# Altium footprint library GyokuRe.PcbLib: 1248 footprints (part 18 of 78)
Each footprint in its own frame and in the unit in brackets; x right, y up, seen from the top. Pads: shape width x height; smd on the part's side, far side on the other; paste and mask are expansions set on the pad; w line width, h text height; cw(c..) or ccw(c..) is an arc to the next point about the centre after c.
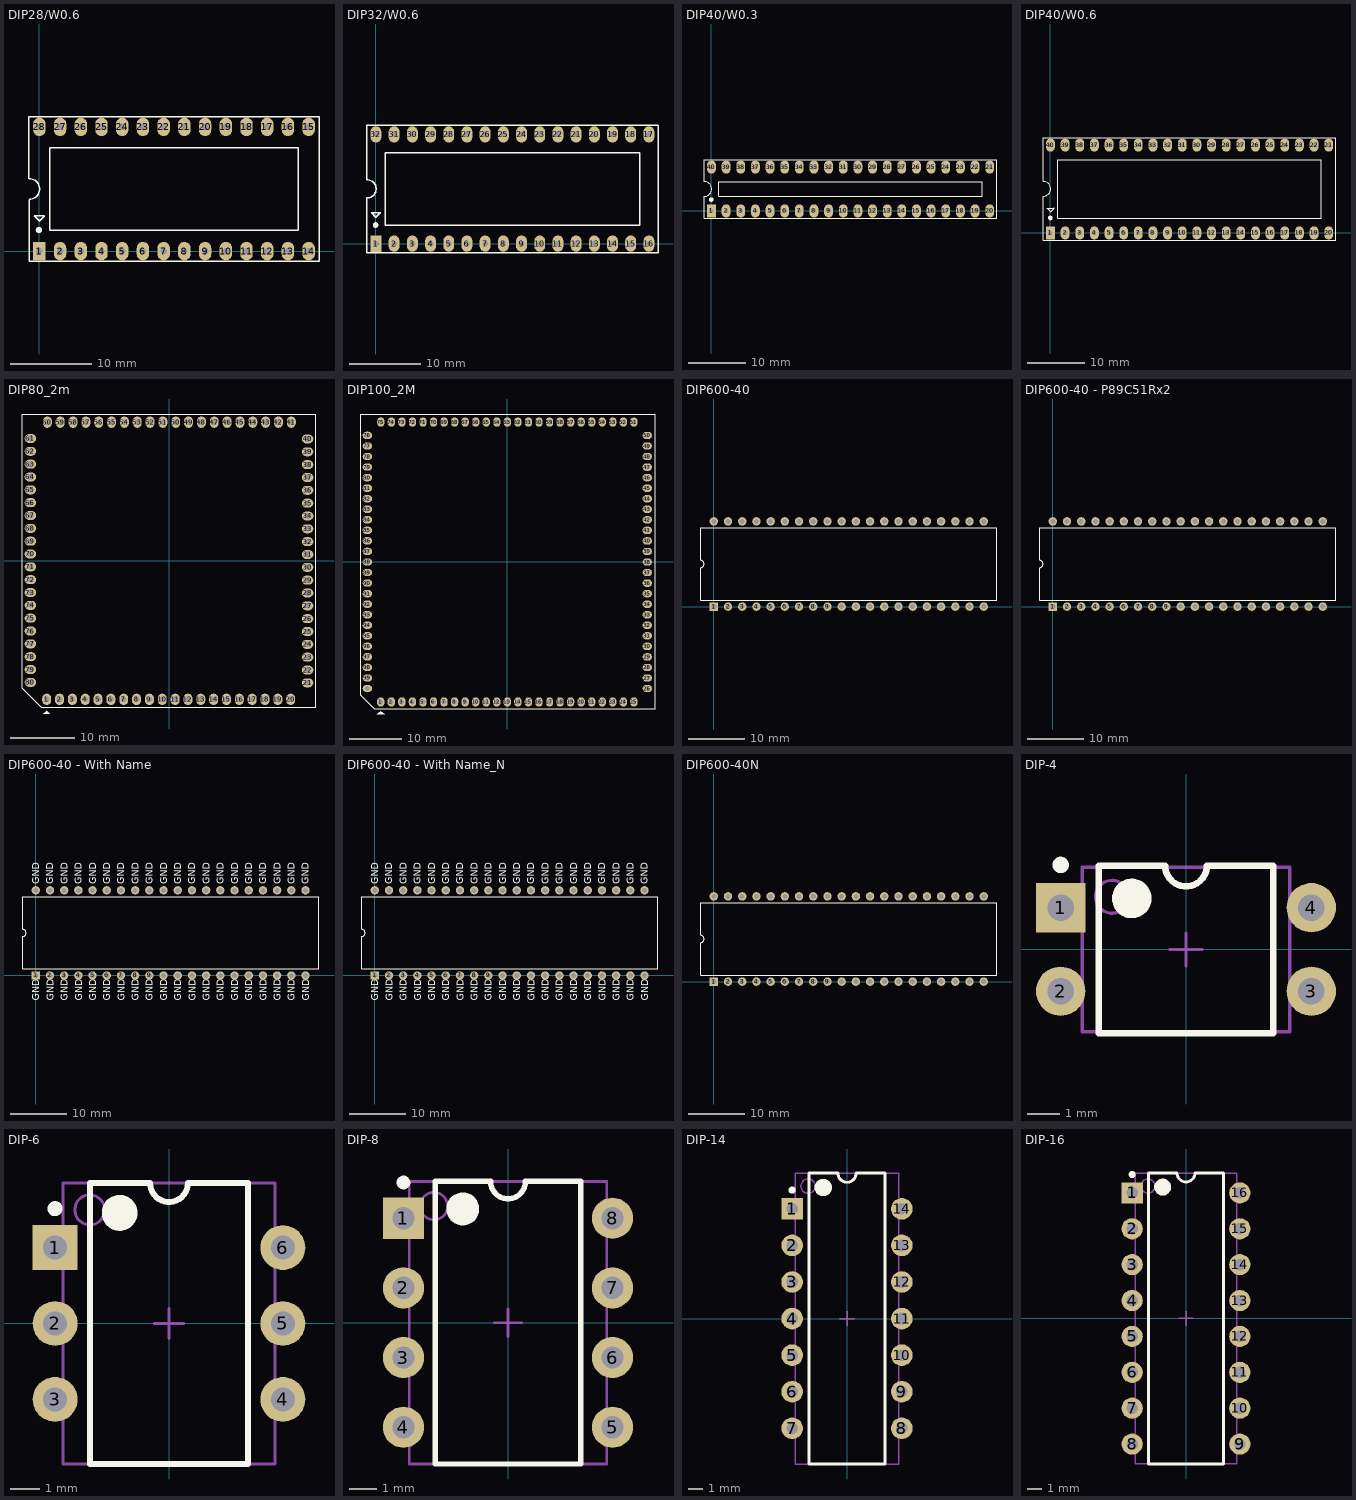
[diagram p17: the footprints below, top view; thin cyan lines are the x and y axes]

## DIP28/W0.6 [mil] "DIP28/W.600, Pin to pin 100mil"
height 100
pads (28):
  rect 60x90 hole 31: 1(0,0)
  oval 60x90 hole 31: 2(100,0) 3(200,0) 4(300,0) 5(400,0) 6(500,0) 7(600,0) 8(700,0) 9(800,0) 10(900,0) 11(1000,0) 12(1100,0) 13(1200,0) 14(1300,0) 15(1300,600) 16(1200,600) 17(1100,600) 18(1000,600) 19(900,600) 20(800,600) 21(700,600) 22(600,600) 23(500,600) 24(400,600) 25(300,600) 26(200,600) 27(100,600) 28(0,600)
Top Overlay:
  circle w15: c-2,102 r8
  lines w7: -51,350 -51,650 1350,650 1350,-50 -50,-50 -50,249 ; -50,250 ccw(c-48.31,299.97) -49.62,349.95 ; -25,170 23,170 24,171 24,169 0,145 0,146 -24,170 -25,170 ; 50,100 50,500 1250,500 1250,100 50,100
3D body "SW3dPS-DIP28-600.STEP": height 224.41, standoff -101.57, extent -84.25,0.16 1384.25,610

## DIP32/W0.6 [mil] "DIP32/W.600, Pin to pin 100mil"
height 100
pads (32):
  rect 60x90 hole 31: 1(0,0)
  oval 60x90 hole 31: 2(100,0) 3(200,0) 4(300,0) 5(400,0) 6(500,0) 7(600,0) 8(700,0) 9(800,0) 10(900,0) 11(1000,0) 12(1100,0) 13(1200,0) 14(1300,0) 15(1400,0) 16(1500,0) 17(1500,600) 18(1400,600) 19(1300,600) 20(1200,600) 21(1100,600) 22(1000,600) 23(900,600) 24(800,600) 25(700,600) 26(600,600) 27(500,600) 28(400,600) 29(300,600) 30(200,600) 31(100,600) 32(0,600)
Top Overlay:
  circle w15: c-2,102 r8
  lines w7: -50.38,251.05 ccw(c-48.69,301.02) -50,351 ; -50,251 -50,-50 1550,-50 1550,650 -50,650 -50,352 ; -25,170 -24,170 0,146 0,145 24,169 24,171 23,170 -25,170 ; 50,100 50,500 1450,500 1450,100 50,100
3D body "SW3DPS-DIP 32 IC WITH 0_380IN WINDOW-DEFAULT.STEP": height 227.95, standoff -129.92, extent -77.56,0 1577.56,601.81

## DIP40/W0.3 [mil] "40 PIN, W 300mil, Pin to pin 100mil"
height 100
pads (40):
  rect 60x90 hole 31: 1(0,0)
  oval 60x90 hole 31: 2(100,0) 3(200,0) 4(300,0) 5(400,0) 6(500,0) 7(600,0) 8(700,0) 9(800,0) 10(900,0) 11(1000,0) 12(1100,0) 13(1200,0) 14(1300,0) 15(1400,0) 16(1500,0) 17(1600,0) 18(1700,0) 19(1800,0) 20(1900,0) 21(1900,300) 22(1800,300) 23(1700,300) 24(1600,300) 25(1500,300) 26(1400,300) 27(1300,300) 28(1200,300) 29(1100,300) 30(1000,300) 31(900,300) 32(800,300) 33(700,300) 34(600,300) 35(500,300) 36(400,300) 37(300,300) 38(200,300) 39(100,300) 40(0,300)
Top Overlay:
  circle w15: c-1,78 r8
  lines w7: -50.38,100.05 ccw(c-48.69,150.02) -50,200 ; -50,100 -50,-50 1950,-50 1950,350 -50,350 -50,201 ; 50,100 1850,100 1850,200 50,200 50,100
3D body "SW3DPS-DIP 40 IC WITH 0_320IN WINDOW-DEFAULT.STEP": height 227.95, standoff -129.92, extent -70,-160.91 2000.87,440.91

## DIP40/W0.6 [mil] "40 PIN, W 600mil, Pin to pin 100mil"
height 100
pads (40):
  rect 60x90 hole 31: 1(0,0)
  oval 60x90 hole 31: 2(100,0) 3(200,0) 4(300,0) 5(400,0) 6(500,0) 7(600,0) 8(700,0) 9(800,0) 10(900,0) 11(1000,0) 12(1100,0) 13(1200,0) 14(1300,0) 15(1400,0) 16(1500,0) 17(1600,0) 18(1700,0) 19(1800,0) 20(1900,0) 21(1900,600) 22(1800,600) 23(1700,600) 24(1600,600) 25(1500,600) 26(1400,600) 27(1300,600) 28(1200,600) 29(1100,600) 30(1000,600) 31(900,600) 32(800,600) 33(700,600) 34(600,600) 35(500,600) 36(400,600) 37(300,600) 38(200,600) 39(100,600) 40(0,600)
Top Overlay:
  circle w15: c-1,102 r8
  lines w7: -50.38,251.05 ccw(c-48.69,301.02) -50,351 ; -50,251 -50,-50 1950,-50 1950,650 -50,650 -50,352 ; -24,170 -23,170 1,146 1,145 25,169 25,171 24,170 -24,170 ; 50,100 1850,100 1850,500 50,500 50,100
3D body "SW3dPS-DIP40-600.STEP": height 224.41, standoff -101.57, extent -82.48,-10 1982.48,599.84

## DIP80_2m [mil] "DIP80, P - P 200"
pads (80):
  oval 55x70 hole 35: 1(-750,-850) 2(-671.26,-850) 3(-592.52,-850) 4(-513.78,-850) 5(-435.04,-850) 6(-356.3,-850) 7(-277.56,-850) 8(-198.82,-850) 9(-120.08,-850) 10(-41.34,-850) 11(37.4,-850) 12(116.14,-850) 13(194.88,-850) 14(273.62,-850) 15(352.36,-850) 16(431.1,-850) 17(509.84,-850) 18(588.58,-850) 19(667.32,-850) 20(746.06,-850) 41(750,850) 42(671.26,850) 43(592.52,850) 44(513.78,850) 45(435.04,850) 46(356.3,850) 47(277.56,850) 48(198.82,850) 49(120.08,850) 50(41.34,850) 51(-37.4,850) 52(-116.14,850) 53(-194.88,850) 54(-273.62,850) 55(-352.36,850) 56(-431.1,850) 57(-509.84,850) 58(-588.58,850) 59(-667.32,850) 60(-746.06,850)
  oval 70x55 hole 35: 21(850,-749) 22(850,-670.26) 23(850,-591.52) 24(850,-512.78) 25(850,-434.04) 26(850,-355.3) 27(850,-276.56) 28(850,-197.82) 29(850,-119.08) 30(850,-40.34) 31(850,38.4) 32(850,117.14) 33(850,195.88) 34(850,274.62) 35(850,353.36) 36(850,432.1) 37(850,510.84) 38(850,589.58) 39(850,668.32) 40(850,747.06) 61(-850,750) 62(-850,671.26) 63(-850,592.52) 64(-850,513.78) 65(-850,435.04) 66(-850,356.3) 67(-850,277.56) 68(-850,198.82) 69(-850,120.08) 70(-850,41.34) 71(-850,-37.4) 72(-850,-116.14) 73(-850,-194.88) 74(-850,-273.62) 75(-850,-352.36) 76(-850,-431.1) 77(-850,-509.84) 78(-850,-588.58) 79(-850,-667.32) 80(-850,-746.06)
Top Overlay:
  region: -770,-940 -750,-920 -730,-940
  lines w7: -900,-783 -900,900 900,900 900,-900 -783,-900 -900,-783

## DIP100_2M [mil] "DIP100 - P-P 2mm"
pads (100):
  oval 55x70 hole 35: 1(-945,-1045) 2(-866.26,-1045) 3(-787.52,-1045) 4(-708.78,-1045) 5(-630.04,-1045) 6(-551.3,-1045) 7(-472.56,-1045) 8(-393.82,-1045) 9(-315.08,-1045) 10(-236.34,-1045) 11(-157.6,-1045) 12(-78.86,-1045) 13(-0.12,-1045) 14(78.62,-1045) 15(157.36,-1045) 16(236.1,-1045) 17(314.84,-1045) 18(393.58,-1045) 19(472.32,-1045) 20(551.06,-1045) 21(629.8,-1045) 22(708.54,-1045) 23(787.28,-1045) 24(866.02,-1045) 25(944.76,-1045) 51(945,1045) 52(866.26,1045) 53(787.52,1045) 54(708.78,1045) 55(630.04,1045) 56(551.3,1045) 57(472.56,1045) 58(393.82,1045) 59(315.08,1045) 60(236.34,1045) 61(157.6,1045) 62(78.86,1045) 63(0.12,1045) 64(-78.62,1045) 65(-157.36,1045) 66(-236.1,1045) 67(-314.84,1045) 68(-393.58,1045) 69(-472.32,1045) 70(-551.06,1045) 71(-629.8,1045) 72(-708.54,1045) 73(-787.28,1045) 74(-866.02,1045) 75(-944.76,1045)
  oval 70x55 hole 35: 26(1045,-945) 27(1045,-866.26) 28(1045,-787.52) 29(1045,-708.78) 30(1045,-630.04) 31(1045,-551.3) 32(1045,-472.56) 33(1045,-393.82) 34(1045,-315.08) 35(1045,-236.34) 36(1045,-157.6) 37(1045,-78.86) 38(1045,-0.12) 39(1045,78.62) 40(1045,157.36) 41(1045,236.1) 42(1045,314.84) 43(1045,393.58) 44(1045,472.32) 45(1045,551.06) 46(1045,629.8) 47(1045,708.54) 48(1045,787.28) 49(1045,866.02) 50(1045,944.76) 76(-1045,945) 77(-1045,866.26) 78(-1045,787.52) 79(-1045,708.78) 80(-1045,630.04) 81(-1045,551.3) 82(-1045,472.56) 83(-1045,393.82) 84(-1045,315.08) 85(-1045,236.34) 86(-1045,157.6) 87(-1045,78.86) 88(-1045,0.12) 89(-1045,-78.62) 90(-1045,-157.36) 91(-1045,-236.1) 92(-1045,-314.84) 93(-1045,-393.58) 94(-1045,-472.32) 95(-1045,-551.06) 96(-1045,-629.8) 97(-1045,-708.54) 98(-1045,-787.28) 99(-1045,-866.02) 100(-1045,-944.76)
Top Overlay:
  region: -945,-1115 -975,-1135 -915,-1135
  lines w7: -1095,-995 -1095,1105 1105,1105 1105,-1095 -995,-1095 -1095,-995

## DIP600-40 [mm] "DIP, Plastic; 40 Leads; Row Spacing 15.24 mm; Pitch 2.54 mm"
height 4.83
pads (40):
  rect 1.5x1.5 hole 0.9: 1(0,0)
  round 1.5 hole 0.9: 2(2.54,0) 3(5.08,0) 4(7.62,0) 5(10.16,0) 6(12.7,0) 7(15.24,0) 8(17.78,0) 9(20.32,0) 10(22.86,0) 11(25.4,0) 12(27.94,0) 13(30.48,0) 14(33.02,0) 15(35.56,0) 16(38.1,0) 17(40.64,0) 18(43.18,0) 19(45.72,0) 20(48.26,0) 21(48.26,15.24) 22(45.72,15.24) 23(43.18,15.24) 24(40.64,15.24) 25(38.1,15.24) 26(35.56,15.24) 27(33.02,15.24) 28(30.48,15.24) 29(27.94,15.24) 30(25.4,15.24) 31(22.86,15.24) 32(20.32,15.24) 33(17.78,15.24) 34(15.24,15.24) 35(12.7,15.24) 36(10.16,15.24) 37(7.62,15.24) 38(5.08,15.24) 39(2.54,15.24) 40(0,15.24)
Top Overlay:
  lines w0.2: -2.37,1.17 -2.37,6.985 ccw(c-2.37,7.62) -2.37,8.255 -2.37,14.07 50.63,14.07 50.63,1.17 -2.37,1.17
3D body: height 3, standoff 2.65, extent 6.87,13.54 8.37,15.24
3D body: height 3, standoff 0.5, extent 6.87,15.065 8.37,15.415
3D body: height 0.5, standoff -3.8, extent 7.345,15.065 7.895,15.415
3D body: height 3, standoff 2.65, extent 4.33,13.54 5.83,15.24
3D body: height 3, standoff 0.5, extent 4.33,15.065 5.83,15.415
3D body: height 0.5, standoff -3.8, extent 4.805,15.065 5.355,15.415
3D body: height 3, standoff 2.65, extent 1.79,13.54 3.29,15.24
3D body: height 3, standoff 0.5, extent 1.79,15.065 3.29,15.415
3D body: height 0.5, standoff -3.8, extent 2.265,15.065 2.815,15.415
3D body: height 3, standoff 2.65, extent -0.75,13.54 0.75,15.24
3D body: height 3, standoff 0.5, extent -0.75,15.065 0.75,15.415
3D body: height 0.5, standoff -3.8, extent -0.275,15.065 0.275,15.415
3D body: height 3, standoff 2.65, extent 17.03,13.54 18.53,15.24
3D body: height 3, standoff 0.5, extent 17.03,15.065 18.53,15.415
3D body: height 0.5, standoff -3.8, extent 17.505,15.065 18.055,15.415
3D body: height 3, standoff 2.65, extent 14.49,13.54 15.99,15.24
3D body: height 3, standoff 0.5, extent 14.49,15.065 15.99,15.415
3D body: height 0.5, standoff -3.8, extent 14.965,15.065 15.515,15.415
3D body: height 3, standoff 2.65, extent 11.95,13.54 13.45,15.24
3D body: height 3, standoff 0.5, extent 11.95,15.065 13.45,15.415
3D body: height 0.5, standoff -3.8, extent 12.425,15.065 12.975,15.415
3D body: height 3, standoff 2.65, extent 9.41,13.54 10.91,15.24
3D body: height 3, standoff 0.5, extent 9.41,15.065 10.91,15.415
3D body: height 0.5, standoff -3.8, extent 9.885,15.065 10.435,15.415
3D body: height 3, standoff 2.65, extent 27.19,13.54 28.69,15.24
3D body: height 3, standoff 0.5, extent 27.19,15.065 28.69,15.415
3D body: height 0.5, standoff -3.8, extent 27.665,15.065 28.215,15.415
3D body: height 3, standoff 2.65, extent 24.65,13.54 26.15,15.24
3D body: height 3, standoff 0.5, extent 24.65,15.065 26.15,15.415
3D body: height 0.5, standoff -3.8, extent 25.125,15.065 25.675,15.415
3D body: height 3, standoff 2.65, extent 22.11,13.54 23.61,15.24
3D body: height 3, standoff 0.5, extent 22.11,15.065 23.61,15.415
3D body: height 0.5, standoff -3.8, extent 22.585,15.065 23.135,15.415
3D body: height 3, standoff 2.65, extent 19.57,13.54 21.07,15.24
3D body: height 3, standoff 0.5, extent 19.57,15.065 21.07,15.415
3D body: height 0.5, standoff -3.8, extent 20.045,15.065 20.595,15.415
3D body: height 3, standoff 2.65, extent 37.35,13.54 38.85,15.24
3D body: height 3, standoff 0.5, extent 37.35,15.065 38.85,15.415
3D body: height 0.5, standoff -3.8, extent 37.825,15.065 38.375,15.415
3D body: height 3, standoff 2.65, extent 34.81,13.54 36.31,15.24
3D body: height 3, standoff 0.5, extent 34.81,15.065 36.31,15.415
3D body: height 0.5, standoff -3.8, extent 35.285,15.065 35.835,15.415
3D body: height 3, standoff 2.65, extent 32.27,13.54 33.77,15.24
3D body: height 3, standoff 0.5, extent 32.27,15.065 33.77,15.415
3D body: height 0.5, standoff -3.8, extent 32.745,15.065 33.295,15.415
3D body: height 3, standoff 2.65, extent 29.73,13.54 31.23,15.24
3D body: height 3, standoff 0.5, extent 29.73,15.065 31.23,15.415
3D body: height 0.5, standoff -3.8, extent 30.205,15.065 30.755,15.415
3D body: height 3, standoff 2.65, extent 47.51,13.54 49.01,15.24
3D body: height 3, standoff 0.5, extent 47.51,15.065 49.01,15.415
3D body: height 0.5, standoff -3.8, extent 47.985,15.065 48.535,15.415
3D body: height 3, standoff 2.65, extent 44.97,13.54 46.47,15.24
3D body: height 3, standoff 0.5, extent 44.97,15.065 46.47,15.415
3D body: height 0.5, standoff -3.8, extent 45.445,15.065 45.995,15.415
3D body: height 3, standoff 2.65, extent 42.43,13.54 43.93,15.24
3D body: height 3, standoff 0.5, extent 42.43,15.065 43.93,15.415
3D body: height 0.5, standoff -3.8, extent 42.905,15.065 43.455,15.415
3D body: height 3, standoff 2.65, extent 39.89,13.54 41.39,15.24
3D body: height 3, standoff 0.5, extent 39.89,15.065 41.39,15.415
3D body: height 0.5, standoff -3.8, extent 40.365,15.065 40.915,15.415
3D body: height 3, standoff 2.65, extent 39.89,0 41.39,1.7
3D body: height 3, standoff 0.5, extent 39.89,-0.175 41.39,0.175
3D body: height 0.5, standoff -3.8, extent 40.365,-0.175 40.915,0.175
3D body: height 3, standoff 2.65, extent 42.43,0 43.93,1.7
3D body: height 3, standoff 0.5, extent 42.43,-0.175 43.93,0.175
3D body: height 0.5, standoff -3.8, extent 42.905,-0.175 43.455,0.175
3D body: height 3, standoff 2.65, extent 44.97,0 46.47,1.7
3D body: height 3, standoff 0.5, extent 44.97,-0.175 46.47,0.175
3D body: height 0.5, standoff -3.8, extent 45.445,-0.175 45.995,0.175
3D body: height 3, standoff 2.65, extent 47.51,0 49.01,1.7
3D body: height 3, standoff 0.5, extent 47.51,-0.175 49.01,0.175
3D body: height 0.5, standoff -3.8, extent 47.985,-0.175 48.535,0.175
3D body: height 3, standoff 2.65, extent 29.73,0 31.23,1.7
3D body: height 3, standoff 0.5, extent 29.73,-0.175 31.23,0.175
3D body: height 0.5, standoff -3.8, extent 30.205,-0.175 30.755,0.175
3D body: height 3, standoff 2.65, extent 32.27,0 33.77,1.7
3D body: height 3, standoff 0.5, extent 32.27,-0.175 33.77,0.175
3D body: height 0.5, standoff -3.8, extent 32.745,-0.175 33.295,0.175
3D body: height 3, standoff 2.65, extent 34.81,0 36.31,1.7
3D body: height 3, standoff 0.5, extent 34.81,-0.175 36.31,0.175
3D body: height 0.5, standoff -3.8, extent 35.285,-0.175 35.835,0.175
3D body: height 3, standoff 2.65, extent 37.35,0 38.85,1.7
3D body: height 3, standoff 0.5, extent 37.35,-0.175 38.85,0.175
3D body: height 0.5, standoff -3.8, extent 37.825,-0.175 38.375,0.175
3D body: height 3, standoff 2.65, extent 19.57,0 21.07,1.7
3D body: height 3, standoff 0.5, extent 19.57,-0.175 21.07,0.175
3D body: height 0.5, standoff -3.8, extent 20.045,-0.175 20.595,0.175
3D body: height 3, standoff 2.65, extent 22.11,0 23.61,1.7
3D body: height 3, standoff 0.5, extent 22.11,-0.175 23.61,0.175
3D body: height 0.5, standoff -3.8, extent 22.585,-0.175 23.135,0.175
3D body: height 3, standoff 2.65, extent 24.65,0 26.15,1.7
3D body: height 3, standoff 0.5, extent 24.65,-0.175 26.15,0.175
3D body: height 0.5, standoff -3.8, extent 25.125,-0.175 25.675,0.175
3D body: height 3, standoff 2.65, extent 27.19,0 28.69,1.7
3D body: height 3, standoff 0.5, extent 27.19,-0.175 28.69,0.175
3D body: height 0.5, standoff -3.8, extent 27.665,-0.175 28.215,0.175
3D body: height 3, standoff 2.65, extent 9.41,0 10.91,1.7
3D body: height 3, standoff 0.5, extent 9.41,-0.175 10.91,0.175
3D body: height 0.5, standoff -3.8, extent 9.885,-0.175 10.435,0.175
3D body: height 3, standoff 2.65, extent 11.95,0 13.45,1.7
3D body: height 3, standoff 0.5, extent 11.95,-0.175 13.45,0.175
3D body: height 0.5, standoff -3.8, extent 12.425,-0.175 12.975,0.175
3D body: height 3, standoff 2.65, extent 14.49,0 15.99,1.7
3D body: height 3, standoff 0.5, extent 14.49,-0.175 15.99,0.175
3D body: height 0.5, standoff -3.8, extent 14.965,-0.175 15.515,0.175
3D body: height 3, standoff 2.65, extent 17.03,0 18.53,1.7
3D body: height 3, standoff 0.5, extent 17.03,-0.175 18.53,0.175
3D body: height 0.5, standoff -3.8, extent 17.505,-0.175 18.055,0.175
3D body: height 0.5, standoff -3.8, extent 7.345,-0.175 7.895,0.175
3D body: height 3, standoff 0.5, extent 6.87,-0.175 8.37,0.175
3D body: height 3, standoff 2.65, extent 6.87,0 8.37,1.7
3D body: height 0.5, standoff -3.8, extent 4.805,-0.175 5.355,0.175
3D body: height 3, standoff 0.5, extent 4.33,-0.175 5.83,0.175
3D body: height 3, standoff 2.65, extent 4.33,0 5.83,1.7
3D body: height 0.5, standoff -3.8, extent 2.265,-0.175 2.815,0.175
3D body: height 3, standoff 0.5, extent 1.79,-0.175 3.29,0.175
3D body: height 3, standoff 2.65, extent 1.79,0 3.29,1.7
3D body: height 0.5, standoff -3.8, extent -0.275,-0.175 0.275,0.175
3D body: height 3, standoff 0.5, extent -0.75,-0.175 0.75,0.175
3D body: height 3, standoff 2.65, extent -0.75,0 0.75,1.7
3D body: height 5.3, standoff 0.3, extent -2.3,1.25 50.65,14
3D body: height 5.4, standoff 4, extent -2.325,6.629 -1.325,8.629

## DIP600-40 - P89C51Rx2 [mm] "DIP, Plastic; 40 Leads; Row Spacing 15.24 mm; Pitch 2.54 mm"
height 4.83
pads (40):
  rect 1.5x1.5 hole 0.9: 1(0,0)
  round 1.5 hole 0.9: 2(2.54,0) 3(5.08,0) 4(7.62,0) 5(10.16,0) 6(12.7,0) 7(15.24,0) 8(17.78,0) 9(20.32,0) 10(22.86,0) 11(25.4,0) 12(27.94,0) 13(30.48,0) 14(33.02,0) 15(35.56,0) 16(38.1,0) 17(40.64,0) 18(43.18,0) 19(45.72,0) 20(48.26,0) 21(48.26,15.24) 22(45.72,15.24) 23(43.18,15.24) 24(40.64,15.24) 25(38.1,15.24) 26(35.56,15.24) 27(33.02,15.24) 28(30.48,15.24) 29(27.94,15.24) 30(25.4,15.24) 31(22.86,15.24) 32(20.32,15.24) 33(17.78,15.24) 34(15.24,15.24) 35(12.7,15.24) 36(10.16,15.24) 37(7.62,15.24) 38(5.08,15.24) 39(2.54,15.24) 40(0,15.24)
Top Overlay:
  lines w0.2: -2.37,1.17 -2.37,6.985 ccw(c-2.37,7.62) -2.37,8.255 -2.37,14.07 50.63,14.07 50.63,1.17 -2.37,1.17
3D body: height 3, standoff 2.65, extent 6.87,13.54 8.37,15.24
3D body: height 3, standoff 0.5, extent 6.87,15.065 8.37,15.415
3D body: height 0.5, standoff -3.8, extent 7.345,15.065 7.895,15.415
3D body: height 3, standoff 2.65, extent 4.33,13.54 5.83,15.24
3D body: height 3, standoff 0.5, extent 4.33,15.065 5.83,15.415
3D body: height 0.5, standoff -3.8, extent 4.805,15.065 5.355,15.415
3D body: height 3, standoff 2.65, extent 1.79,13.54 3.29,15.24
3D body: height 3, standoff 0.5, extent 1.79,15.065 3.29,15.415
3D body: height 0.5, standoff -3.8, extent 2.265,15.065 2.815,15.415
3D body: height 3, standoff 2.65, extent -0.75,13.54 0.75,15.24
3D body: height 3, standoff 0.5, extent -0.75,15.065 0.75,15.415
3D body: height 0.5, standoff -3.8, extent -0.275,15.065 0.275,15.415
3D body: height 3, standoff 2.65, extent 17.03,13.54 18.53,15.24
3D body: height 3, standoff 0.5, extent 17.03,15.065 18.53,15.415
3D body: height 0.5, standoff -3.8, extent 17.505,15.065 18.055,15.415
3D body: height 3, standoff 2.65, extent 14.49,13.54 15.99,15.24
3D body: height 3, standoff 0.5, extent 14.49,15.065 15.99,15.415
3D body: height 0.5, standoff -3.8, extent 14.965,15.065 15.515,15.415
3D body: height 3, standoff 2.65, extent 11.95,13.54 13.45,15.24
3D body: height 3, standoff 0.5, extent 11.95,15.065 13.45,15.415
3D body: height 0.5, standoff -3.8, extent 12.425,15.065 12.975,15.415
3D body: height 3, standoff 2.65, extent 9.41,13.54 10.91,15.24
3D body: height 3, standoff 0.5, extent 9.41,15.065 10.91,15.415
3D body: height 0.5, standoff -3.8, extent 9.885,15.065 10.435,15.415
3D body: height 3, standoff 2.65, extent 27.19,13.54 28.69,15.24
3D body: height 3, standoff 0.5, extent 27.19,15.065 28.69,15.415
3D body: height 0.5, standoff -3.8, extent 27.665,15.065 28.215,15.415
3D body: height 3, standoff 2.65, extent 24.65,13.54 26.15,15.24
3D body: height 3, standoff 0.5, extent 24.65,15.065 26.15,15.415
3D body: height 0.5, standoff -3.8, extent 25.125,15.065 25.675,15.415
3D body: height 3, standoff 2.65, extent 22.11,13.54 23.61,15.24
3D body: height 3, standoff 0.5, extent 22.11,15.065 23.61,15.415
3D body: height 0.5, standoff -3.8, extent 22.585,15.065 23.135,15.415
3D body: height 3, standoff 2.65, extent 19.57,13.54 21.07,15.24
3D body: height 3, standoff 0.5, extent 19.57,15.065 21.07,15.415
3D body: height 0.5, standoff -3.8, extent 20.045,15.065 20.595,15.415
3D body: height 3, standoff 2.65, extent 37.35,13.54 38.85,15.24
3D body: height 3, standoff 0.5, extent 37.35,15.065 38.85,15.415
3D body: height 0.5, standoff -3.8, extent 37.825,15.065 38.375,15.415
3D body: height 3, standoff 2.65, extent 34.81,13.54 36.31,15.24
3D body: height 3, standoff 0.5, extent 34.81,15.065 36.31,15.415
3D body: height 0.5, standoff -3.8, extent 35.285,15.065 35.835,15.415
3D body: height 3, standoff 2.65, extent 32.27,13.54 33.77,15.24
3D body: height 3, standoff 0.5, extent 32.27,15.065 33.77,15.415
3D body: height 0.5, standoff -3.8, extent 32.745,15.065 33.295,15.415
3D body: height 3, standoff 2.65, extent 29.73,13.54 31.23,15.24
3D body: height 3, standoff 0.5, extent 29.73,15.065 31.23,15.415
3D body: height 0.5, standoff -3.8, extent 30.205,15.065 30.755,15.415
3D body: height 3, standoff 2.65, extent 47.51,13.54 49.01,15.24
3D body: height 3, standoff 0.5, extent 47.51,15.065 49.01,15.415
3D body: height 0.5, standoff -3.8, extent 47.985,15.065 48.535,15.415
3D body: height 3, standoff 2.65, extent 44.97,13.54 46.47,15.24
3D body: height 3, standoff 0.5, extent 44.97,15.065 46.47,15.415
3D body: height 0.5, standoff -3.8, extent 45.445,15.065 45.995,15.415
3D body: height 3, standoff 2.65, extent 42.43,13.54 43.93,15.24
3D body: height 3, standoff 0.5, extent 42.43,15.065 43.93,15.415
3D body: height 0.5, standoff -3.8, extent 42.905,15.065 43.455,15.415
3D body: height 3, standoff 2.65, extent 39.89,13.54 41.39,15.24
3D body: height 3, standoff 0.5, extent 39.89,15.065 41.39,15.415
3D body: height 0.5, standoff -3.8, extent 40.365,15.065 40.915,15.415
3D body: height 3, standoff 2.65, extent 39.89,0 41.39,1.7
3D body: height 3, standoff 0.5, extent 39.89,-0.175 41.39,0.175
3D body: height 0.5, standoff -3.8, extent 40.365,-0.175 40.915,0.175
3D body: height 3, standoff 2.65, extent 42.43,0 43.93,1.7
3D body: height 3, standoff 0.5, extent 42.43,-0.175 43.93,0.175
3D body: height 0.5, standoff -3.8, extent 42.905,-0.175 43.455,0.175
3D body: height 3, standoff 2.65, extent 44.97,0 46.47,1.7
3D body: height 3, standoff 0.5, extent 44.97,-0.175 46.47,0.175
3D body: height 0.5, standoff -3.8, extent 45.445,-0.175 45.995,0.175
3D body: height 3, standoff 2.65, extent 47.51,0 49.01,1.7
3D body: height 3, standoff 0.5, extent 47.51,-0.175 49.01,0.175
3D body: height 0.5, standoff -3.8, extent 47.985,-0.175 48.535,0.175
3D body: height 3, standoff 2.65, extent 29.73,0 31.23,1.7
3D body: height 3, standoff 0.5, extent 29.73,-0.175 31.23,0.175
3D body: height 0.5, standoff -3.8, extent 30.205,-0.175 30.755,0.175
3D body: height 3, standoff 2.65, extent 32.27,0 33.77,1.7
3D body: height 3, standoff 0.5, extent 32.27,-0.175 33.77,0.175
3D body: height 0.5, standoff -3.8, extent 32.745,-0.175 33.295,0.175
3D body: height 3, standoff 2.65, extent 34.81,0 36.31,1.7
3D body: height 3, standoff 0.5, extent 34.81,-0.175 36.31,0.175
3D body: height 0.5, standoff -3.8, extent 35.285,-0.175 35.835,0.175
3D body: height 3, standoff 2.65, extent 37.35,0 38.85,1.7
3D body: height 3, standoff 0.5, extent 37.35,-0.175 38.85,0.175
3D body: height 0.5, standoff -3.8, extent 37.825,-0.175 38.375,0.175
3D body: height 3, standoff 2.65, extent 19.57,0 21.07,1.7
3D body: height 3, standoff 0.5, extent 19.57,-0.175 21.07,0.175
3D body: height 0.5, standoff -3.8, extent 20.045,-0.175 20.595,0.175
3D body: height 3, standoff 2.65, extent 22.11,0 23.61,1.7
3D body: height 3, standoff 0.5, extent 22.11,-0.175 23.61,0.175
3D body: height 0.5, standoff -3.8, extent 22.585,-0.175 23.135,0.175
3D body: height 3, standoff 2.65, extent 24.65,0 26.15,1.7
3D body: height 3, standoff 0.5, extent 24.65,-0.175 26.15,0.175
3D body: height 0.5, standoff -3.8, extent 25.125,-0.175 25.675,0.175
3D body: height 3, standoff 2.65, extent 27.19,0 28.69,1.7
3D body: height 3, standoff 0.5, extent 27.19,-0.175 28.69,0.175
3D body: height 0.5, standoff -3.8, extent 27.665,-0.175 28.215,0.175
3D body: height 3, standoff 2.65, extent 9.41,0 10.91,1.7
3D body: height 3, standoff 0.5, extent 9.41,-0.175 10.91,0.175
3D body: height 0.5, standoff -3.8, extent 9.885,-0.175 10.435,0.175
3D body: height 3, standoff 2.65, extent 11.95,0 13.45,1.7
3D body: height 3, standoff 0.5, extent 11.95,-0.175 13.45,0.175
3D body: height 0.5, standoff -3.8, extent 12.425,-0.175 12.975,0.175
3D body: height 3, standoff 2.65, extent 14.49,0 15.99,1.7
3D body: height 3, standoff 0.5, extent 14.49,-0.175 15.99,0.175
3D body: height 0.5, standoff -3.8, extent 14.965,-0.175 15.515,0.175
3D body: height 3, standoff 2.65, extent 17.03,0 18.53,1.7
3D body: height 3, standoff 0.5, extent 17.03,-0.175 18.53,0.175
3D body: height 0.5, standoff -3.8, extent 17.505,-0.175 18.055,0.175
3D body: height 0.5, standoff -3.8, extent 7.345,-0.175 7.895,0.175
3D body: height 3, standoff 0.5, extent 6.87,-0.175 8.37,0.175
3D body: height 3, standoff 2.65, extent 6.87,0 8.37,1.7
3D body: height 0.5, standoff -3.8, extent 4.805,-0.175 5.355,0.175
3D body: height 3, standoff 0.5, extent 4.33,-0.175 5.83,0.175
3D body: height 3, standoff 2.65, extent 4.33,0 5.83,1.7
3D body: height 0.5, standoff -3.8, extent 2.265,-0.175 2.815,0.175
3D body: height 3, standoff 0.5, extent 1.79,-0.175 3.29,0.175
3D body: height 3, standoff 2.65, extent 1.79,0 3.29,1.7
3D body: height 0.5, standoff -3.8, extent -0.275,-0.175 0.275,0.175
3D body: height 3, standoff 0.5, extent -0.75,-0.175 0.75,0.175
3D body: height 3, standoff 2.65, extent -0.75,0 0.75,1.7
3D body: height 5.3, standoff 0.3, extent -2.3,1.25 50.65,14
3D body: height 5.4, standoff 4, extent -2.325,6.629 -1.325,8.629

## DIP600-40 - With Name [mm] "DIP, Plastic; 40 Leads; Row Spacing 15.24 mm; Pitch 2.54 mm"
height 4.83
pads (40):
  rect 1.5x1.5 hole 0.9: 1(0,0)
  round 1.5 hole 0.9: 2(2.54,0) 3(5.08,0) 4(7.62,0) 5(10.16,0) 6(12.7,0) 7(15.24,0) 8(17.78,0) 9(20.32,0) 10(22.86,0) 11(25.4,0) 12(27.94,0) 13(30.48,0) 14(33.02,0) 15(35.56,0) 16(38.1,0) 17(40.64,0) 18(43.18,0) 19(45.72,0) 20(48.26,0) 21(48.26,15.24) 22(45.72,15.24) 23(43.18,15.24) 24(40.64,15.24) 25(38.1,15.24) 26(35.56,15.24) 27(33.02,15.24) 28(30.48,15.24) 29(27.94,15.24) 30(25.4,15.24) 31(22.86,15.24) 32(20.32,15.24) 33(17.78,15.24) 34(15.24,15.24) 35(12.7,15.24) 36(10.16,15.24) 37(7.62,15.24) 38(5.08,15.24) 39(2.54,15.24) 40(0,15.24)
Top Overlay:
  lines w0.2: -2.37,1.17 -2.37,6.985 ccw(c-2.37,7.62) -2.37,8.255 -2.37,14.07 50.63,14.07 50.63,1.17 -2.37,1.17
  text "GND" at 31.13,-4.565 h1.27
  text "GND" at 33.67,-4.565 h1.27
  text "GND" at 38.75,-4.565 h1.27
  text "GND" at 36.21,-4.565 h1.27
  text "GND" at 41.29,-4.565 h1.27
  text "GND" at 43.83,-4.565 h1.27
  text "GND" at 48.91,-4.565 h1.27
  text "GND" at 46.37,-4.565 h1.27
  text "GND" at 20.97,-4.565 h1.27
  text "GND" at 23.51,-4.565 h1.27
  text "GND" at 28.59,-4.565 h1.27
  text "GND" at 26.05,-4.565 h1.27
  text "GND" at 10.81,-4.565 h1.27
  text "GND" at 13.35,-4.565 h1.27
  text "GND" at 18.43,-4.565 h1.27
  text "GND" at 15.89,-4.565 h1.27
  text "GND" at 0.65,-4.565 h1.27
  text "GND" at 3.19,-4.565 h1.27
  text "GND" at 8.27,-4.565 h1.27
  text "GND" at 5.73,-4.565 h1.27
  text "GND" at 41.265,16.35 h1.27
  text "GND" at 43.805,16.35 h1.27
  text "GND" at 48.885,16.35 h1.27
  text "GND" at 46.345,16.35 h1.27
  text "GND" at 31.105,16.35 h1.27
  text "GND" at 33.645,16.35 h1.27
  text "GND" at 38.725,16.35 h1.27
  text "GND" at 36.185,16.35 h1.27
  text "GND" at 20.945,16.35 h1.27
  text "GND" at 23.485,16.35 h1.27
  text "GND" at 28.565,16.35 h1.27
  text "GND" at 26.025,16.35 h1.27
  text "GND" at 10.785,16.35 h1.27
  text "GND" at 13.325,16.35 h1.27
  text "GND" at 18.405,16.35 h1.27
  text "GND" at 15.865,16.35 h1.27
  text "GND" at 5.705,16.35 h1.27
  text "GND" at 8.245,16.35 h1.27
  text "GND" at 3.165,16.35 h1.27
  text "GND" at 0.625,16.35 h1.27
Bottom Overlay:
  lines w0.254: -2.525,-1.025 -2.525,16.35 50.675,16.35 50.675,-1.025 -2.525,-1.025
  text "GND" at 1.955,-4.85 h1.27
  text "GND" at -0.585,-4.85 h1.27
  text "GND" at 9.575,-4.85 h1.27
  text "GND" at 7.035,-4.85 h1.27
  text "GND" at 4.495,-4.85 h1.27
  text "GND" at 17.195,-4.85 h1.27
  text "GND" at 14.655,-4.85 h1.27
  text "GND" at 12.115,-4.85 h1.27
  text "GND" at 24.815,-4.85 h1.27
  text "GND" at 22.275,-4.85 h1.27
  text "GND" at 19.735,-4.85 h1.27
  text "GND" at 32.435,-4.85 h1.27
  text "GND" at 29.895,-4.85 h1.27
  text "GND" at 27.355,-4.85 h1.27
  text "GND" at 40.055,-4.85 h1.27
  text "GND" at 37.515,-4.85 h1.27
  text "GND" at 34.975,-4.85 h1.27
  text "GND" at 42.595,-4.85 h1.27
  text "GND" at 45.135,-4.85 h1.27
  text "GND" at 47.675,-4.85 h1.27
  text "GND" at 46.325,20.15 h1.27
  text "GND" at 48.825,20.125 h1.27
  text "GND" at 38.65,20.15 h1.27
  text "GND" at 41.19,20.15 h1.27
  text "GND" at 43.73,20.15 h1.27
  text "GND" at 31.03,20.15 h1.27
  text "GND" at 33.57,20.15 h1.27
  text "GND" at 36.11,20.15 h1.27
  text "GND" at 23.41,20.15 h1.27
  text "GND" at 25.95,20.15 h1.27
  text "GND" at 28.49,20.15 h1.27
  text "GND" at 15.79,20.15 h1.27
  text "GND" at 18.33,20.15 h1.27
  text "GND" at 20.87,20.15 h1.27
  text "GND" at 8.17,20.15 h1.27
  text "GND" at 10.71,20.15 h1.27
  text "GND" at 13.25,20.15 h1.27
  text "GND" at 5.63,20.15 h1.27
  text "GND" at 3.09,20.15 h1.27
  text "GND" at 0.55,20.15 h1.27
3D body: height 3, standoff 2.65, extent 6.87,13.54 8.37,15.24
3D body: height 3, standoff 0.5, extent 6.87,15.065 8.37,15.415
3D body: height 0.5, standoff -3.8, extent 7.345,15.065 7.895,15.415
3D body: height 3, standoff 2.65, extent 4.33,13.54 5.83,15.24
3D body: height 3, standoff 0.5, extent 4.33,15.065 5.83,15.415
3D body: height 0.5, standoff -3.8, extent 4.805,15.065 5.355,15.415
3D body: height 3, standoff 2.65, extent 1.79,13.54 3.29,15.24
3D body: height 3, standoff 0.5, extent 1.79,15.065 3.29,15.415
3D body: height 0.5, standoff -3.8, extent 2.265,15.065 2.815,15.415
3D body: height 3, standoff 2.65, extent -0.75,13.54 0.75,15.24
3D body: height 3, standoff 0.5, extent -0.75,15.065 0.75,15.415
3D body: height 0.5, standoff -3.8, extent -0.275,15.065 0.275,15.415
3D body: height 3, standoff 2.65, extent 17.03,13.54 18.53,15.24
3D body: height 3, standoff 0.5, extent 17.03,15.065 18.53,15.415
3D body: height 0.5, standoff -3.8, extent 17.505,15.065 18.055,15.415
3D body: height 3, standoff 2.65, extent 14.49,13.54 15.99,15.24
3D body: height 3, standoff 0.5, extent 14.49,15.065 15.99,15.415
3D body: height 0.5, standoff -3.8, extent 14.965,15.065 15.515,15.415
3D body: height 3, standoff 2.65, extent 11.95,13.54 13.45,15.24
3D body: height 3, standoff 0.5, extent 11.95,15.065 13.45,15.415
3D body: height 0.5, standoff -3.8, extent 12.425,15.065 12.975,15.415
3D body: height 3, standoff 2.65, extent 9.41,13.54 10.91,15.24
3D body: height 3, standoff 0.5, extent 9.41,15.065 10.91,15.415
3D body: height 0.5, standoff -3.8, extent 9.885,15.065 10.435,15.415
3D body: height 3, standoff 2.65, extent 27.19,13.54 28.69,15.24
3D body: height 3, standoff 0.5, extent 27.19,15.065 28.69,15.415
3D body: height 0.5, standoff -3.8, extent 27.665,15.065 28.215,15.415
3D body: height 3, standoff 2.65, extent 24.65,13.54 26.15,15.24
3D body: height 3, standoff 0.5, extent 24.65,15.065 26.15,15.415
3D body: height 0.5, standoff -3.8, extent 25.125,15.065 25.675,15.415
3D body: height 3, standoff 2.65, extent 22.11,13.54 23.61,15.24
3D body: height 3, standoff 0.5, extent 22.11,15.065 23.61,15.415
3D body: height 0.5, standoff -3.8, extent 22.585,15.065 23.135,15.415
3D body: height 3, standoff 2.65, extent 19.57,13.54 21.07,15.24
3D body: height 3, standoff 0.5, extent 19.57,15.065 21.07,15.415
3D body: height 0.5, standoff -3.8, extent 20.045,15.065 20.595,15.415
3D body: height 3, standoff 2.65, extent 37.35,13.54 38.85,15.24
3D body: height 3, standoff 0.5, extent 37.35,15.065 38.85,15.415
3D body: height 0.5, standoff -3.8, extent 37.825,15.065 38.375,15.415
3D body: height 3, standoff 2.65, extent 34.81,13.54 36.31,15.24
3D body: height 3, standoff 0.5, extent 34.81,15.065 36.31,15.415
3D body: height 0.5, standoff -3.8, extent 35.285,15.065 35.835,15.415
3D body: height 3, standoff 2.65, extent 32.27,13.54 33.77,15.24
3D body: height 3, standoff 0.5, extent 32.27,15.065 33.77,15.415
3D body: height 0.5, standoff -3.8, extent 32.745,15.065 33.295,15.415
3D body: height 3, standoff 2.65, extent 29.73,13.54 31.23,15.24
3D body: height 3, standoff 0.5, extent 29.73,15.065 31.23,15.415
3D body: height 0.5, standoff -3.8, extent 30.205,15.065 30.755,15.415
3D body: height 3, standoff 2.65, extent 47.51,13.54 49.01,15.24
3D body: height 3, standoff 0.5, extent 47.51,15.065 49.01,15.415
3D body: height 0.5, standoff -3.8, extent 47.985,15.065 48.535,15.415
3D body: height 3, standoff 2.65, extent 44.97,13.54 46.47,15.24
3D body: height 3, standoff 0.5, extent 44.97,15.065 46.47,15.415
3D body: height 0.5, standoff -3.8, extent 45.445,15.065 45.995,15.415
3D body: height 3, standoff 2.65, extent 42.43,13.54 43.93,15.24
3D body: height 3, standoff 0.5, extent 42.43,15.065 43.93,15.415
3D body: height 0.5, standoff -3.8, extent 42.905,15.065 43.455,15.415
3D body: height 3, standoff 2.65, extent 39.89,13.54 41.39,15.24
3D body: height 3, standoff 0.5, extent 39.89,15.065 41.39,15.415
3D body: height 0.5, standoff -3.8, extent 40.365,15.065 40.915,15.415
3D body: height 3, standoff 2.65, extent 39.89,0 41.39,1.7
3D body: height 3, standoff 0.5, extent 39.89,-0.175 41.39,0.175
3D body: height 0.5, standoff -3.8, extent 40.365,-0.175 40.915,0.175
3D body: height 3, standoff 2.65, extent 42.43,0 43.93,1.7
3D body: height 3, standoff 0.5, extent 42.43,-0.175 43.93,0.175
3D body: height 0.5, standoff -3.8, extent 42.905,-0.175 43.455,0.175
3D body: height 3, standoff 2.65, extent 44.97,0 46.47,1.7
3D body: height 3, standoff 0.5, extent 44.97,-0.175 46.47,0.175
3D body: height 0.5, standoff -3.8, extent 45.445,-0.175 45.995,0.175
3D body: height 3, standoff 2.65, extent 47.51,0 49.01,1.7
3D body: height 3, standoff 0.5, extent 47.51,-0.175 49.01,0.175
3D body: height 0.5, standoff -3.8, extent 47.985,-0.175 48.535,0.175
3D body: height 3, standoff 2.65, extent 29.73,0 31.23,1.7
3D body: height 3, standoff 0.5, extent 29.73,-0.175 31.23,0.175
3D body: height 0.5, standoff -3.8, extent 30.205,-0.175 30.755,0.175
3D body: height 3, standoff 2.65, extent 32.27,0 33.77,1.7
3D body: height 3, standoff 0.5, extent 32.27,-0.175 33.77,0.175
3D body: height 0.5, standoff -3.8, extent 32.745,-0.175 33.295,0.175
3D body: height 3, standoff 2.65, extent 34.81,0 36.31,1.7
3D body: height 3, standoff 0.5, extent 34.81,-0.175 36.31,0.175
3D body: height 0.5, standoff -3.8, extent 35.285,-0.175 35.835,0.175
3D body: height 3, standoff 2.65, extent 37.35,0 38.85,1.7
3D body: height 3, standoff 0.5, extent 37.35,-0.175 38.85,0.175
3D body: height 0.5, standoff -3.8, extent 37.825,-0.175 38.375,0.175
3D body: height 3, standoff 2.65, extent 19.57,0 21.07,1.7
3D body: height 3, standoff 0.5, extent 19.57,-0.175 21.07,0.175
3D body: height 0.5, standoff -3.8, extent 20.045,-0.175 20.595,0.175
3D body: height 3, standoff 2.65, extent 22.11,0 23.61,1.7
3D body: height 3, standoff 0.5, extent 22.11,-0.175 23.61,0.175
3D body: height 0.5, standoff -3.8, extent 22.585,-0.175 23.135,0.175
3D body: height 3, standoff 2.65, extent 24.65,0 26.15,1.7
3D body: height 3, standoff 0.5, extent 24.65,-0.175 26.15,0.175
3D body: height 0.5, standoff -3.8, extent 25.125,-0.175 25.675,0.175
3D body: height 3, standoff 2.65, extent 27.19,0 28.69,1.7
3D body: height 3, standoff 0.5, extent 27.19,-0.175 28.69,0.175
3D body: height 0.5, standoff -3.8, extent 27.665,-0.175 28.215,0.175
3D body: height 3, standoff 2.65, extent 9.41,0 10.91,1.7
3D body: height 3, standoff 0.5, extent 9.41,-0.175 10.91,0.175
3D body: height 0.5, standoff -3.8, extent 9.885,-0.175 10.435,0.175
3D body: height 3, standoff 2.65, extent 11.95,0 13.45,1.7
3D body: height 3, standoff 0.5, extent 11.95,-0.175 13.45,0.175
3D body: height 0.5, standoff -3.8, extent 12.425,-0.175 12.975,0.175
3D body: height 3, standoff 2.65, extent 14.49,0 15.99,1.7
3D body: height 3, standoff 0.5, extent 14.49,-0.175 15.99,0.175
3D body: height 0.5, standoff -3.8, extent 14.965,-0.175 15.515,0.175
3D body: height 3, standoff 2.65, extent 17.03,0 18.53,1.7
3D body: height 3, standoff 0.5, extent 17.03,-0.175 18.53,0.175
3D body: height 0.5, standoff -3.8, extent 17.505,-0.175 18.055,0.175
3D body: height 0.5, standoff -3.8, extent 7.345,-0.175 7.895,0.175
3D body: height 3, standoff 0.5, extent 6.87,-0.175 8.37,0.175
3D body: height 3, standoff 2.65, extent 6.87,0 8.37,1.7
3D body: height 0.5, standoff -3.8, extent 4.805,-0.175 5.355,0.175
3D body: height 3, standoff 0.5, extent 4.33,-0.175 5.83,0.175
3D body: height 3, standoff 2.65, extent 4.33,0 5.83,1.7
3D body: height 0.5, standoff -3.8, extent 2.265,-0.175 2.815,0.175
3D body: height 3, standoff 0.5, extent 1.79,-0.175 3.29,0.175
3D body: height 3, standoff 2.65, extent 1.79,0 3.29,1.7
3D body: height 0.5, standoff -3.8, extent -0.275,-0.175 0.275,0.175
3D body: height 3, standoff 0.5, extent -0.75,-0.175 0.75,0.175
3D body: height 3, standoff 2.65, extent -0.75,0 0.75,1.7
3D body: height 5.3, standoff 0.3, extent -2.3,1.25 50.65,14
3D body: height 5.4, standoff 4, extent -2.325,6.629 -1.325,8.629

## DIP600-40 - With Name_N [mm] "DIP, Plastic; 40 Leads; Row Spacing 15.24 mm; Pitch 2.54 mm"
height 4.83
pads (40):
  rect 1.5x1.5 hole 0.9: 1(0,0)
  round 1.5 hole 0.9: 2(2.54,0) 3(5.08,0) 4(7.62,0) 5(10.16,0) 6(12.7,0) 7(15.24,0) 8(17.78,0) 9(20.32,0) 10(22.86,0) 11(25.4,0) 12(27.94,0) 13(30.48,0) 14(33.02,0) 15(35.56,0) 16(38.1,0) 17(40.64,0) 18(43.18,0) 19(45.72,0) 20(48.26,0) 21(48.26,15.24) 22(45.72,15.24) 23(43.18,15.24) 24(40.64,15.24) 25(38.1,15.24) 26(35.56,15.24) 27(33.02,15.24) 28(30.48,15.24) 29(27.94,15.24) 30(25.4,15.24) 31(22.86,15.24) 32(20.32,15.24) 33(17.78,15.24) 34(15.24,15.24) 35(12.7,15.24) 36(10.16,15.24) 37(7.62,15.24) 38(5.08,15.24) 39(2.54,15.24) 40(0,15.24)
Top Overlay:
  lines w0.2: -2.37,1.17 -2.37,6.985 ccw(c-2.37,7.62) -2.37,8.255 -2.37,14.07 50.63,14.07 50.63,1.17 -2.37,1.17
  text "GND" at 31.13,-4.565 h1.27
  text "GND" at 33.67,-4.565 h1.27
  text "GND" at 38.75,-4.565 h1.27
  text "GND" at 36.21,-4.565 h1.27
  text "GND" at 41.29,-4.565 h1.27
  text "GND" at 43.83,-4.565 h1.27
  text "GND" at 48.91,-4.565 h1.27
  text "GND" at 46.37,-4.565 h1.27
  text "GND" at 20.97,-4.565 h1.27
  text "GND" at 23.51,-4.565 h1.27
  text "GND" at 28.59,-4.565 h1.27
  text "GND" at 26.05,-4.565 h1.27
  text "GND" at 10.81,-4.565 h1.27
  text "GND" at 13.35,-4.565 h1.27
  text "GND" at 18.43,-4.565 h1.27
  text "GND" at 15.89,-4.565 h1.27
  text "GND" at 0.65,-4.565 h1.27
  text "GND" at 3.19,-4.565 h1.27
  text "GND" at 8.27,-4.565 h1.27
  text "GND" at 5.73,-4.565 h1.27
  text "GND" at 41.265,16.35 h1.27
  text "GND" at 43.805,16.35 h1.27
  text "GND" at 48.885,16.35 h1.27
  text "GND" at 46.345,16.35 h1.27
  text "GND" at 31.105,16.35 h1.27
  text "GND" at 33.645,16.35 h1.27
  text "GND" at 38.725,16.35 h1.27
  text "GND" at 36.185,16.35 h1.27
  text "GND" at 20.945,16.35 h1.27
  text "GND" at 23.485,16.35 h1.27
  text "GND" at 28.565,16.35 h1.27
  text "GND" at 26.025,16.35 h1.27
  text "GND" at 10.785,16.35 h1.27
  text "GND" at 13.325,16.35 h1.27
  text "GND" at 18.405,16.35 h1.27
  text "GND" at 15.865,16.35 h1.27
  text "GND" at 5.705,16.35 h1.27
  text "GND" at 8.245,16.35 h1.27
  text "GND" at 3.165,16.35 h1.27
  text "GND" at 0.625,16.35 h1.27
Bottom Overlay:
  lines w0.254: -2.525,-1.025 -2.525,16.35 50.675,16.35 50.675,-1.025 -2.525,-1.025
  text "GND" at 1.955,-4.85 h1.27
  text "GND" at -0.585,-4.85 h1.27
  text "GND" at 9.575,-4.85 h1.27
  text "GND" at 7.035,-4.85 h1.27
  text "GND" at 4.495,-4.85 h1.27
  text "GND" at 17.195,-4.85 h1.27
  text "GND" at 14.655,-4.85 h1.27
  text "GND" at 12.115,-4.85 h1.27
  text "GND" at 24.815,-4.85 h1.27
  text "GND" at 22.275,-4.85 h1.27
  text "GND" at 19.735,-4.85 h1.27
  text "GND" at 32.435,-4.85 h1.27
  text "GND" at 29.895,-4.85 h1.27
  text "GND" at 27.355,-4.85 h1.27
  text "GND" at 40.055,-4.85 h1.27
  text "GND" at 37.515,-4.85 h1.27
  text "GND" at 34.975,-4.85 h1.27
  text "GND" at 42.595,-4.85 h1.27
  text "GND" at 45.135,-4.85 h1.27
  text "GND" at 47.675,-4.85 h1.27
  text "GND" at 46.325,20.15 h1.27
  text "GND" at 48.825,20.125 h1.27
  text "GND" at 38.65,20.15 h1.27
  text "GND" at 41.19,20.15 h1.27
  text "GND" at 43.73,20.15 h1.27
  text "GND" at 31.03,20.15 h1.27
  text "GND" at 33.57,20.15 h1.27
  text "GND" at 36.11,20.15 h1.27
  text "GND" at 23.41,20.15 h1.27
  text "GND" at 25.95,20.15 h1.27
  text "GND" at 28.49,20.15 h1.27
  text "GND" at 15.79,20.15 h1.27
  text "GND" at 18.33,20.15 h1.27
  text "GND" at 20.87,20.15 h1.27
  text "GND" at 8.17,20.15 h1.27
  text "GND" at 10.71,20.15 h1.27
  text "GND" at 13.25,20.15 h1.27
  text "GND" at 5.63,20.15 h1.27
  text "GND" at 3.09,20.15 h1.27
  text "GND" at 0.55,20.15 h1.27
3D body "DIP40-600.STEP": height 5.7, standoff -2.58, extent -2.125,-0.165 50.325,15.325

## DIP600-40N [mm] "DIP, Plastic; 40 Leads; Row Spacing 15.24 mm; Pitch 2.54 mm"
height 4.83
pads (40):
  rect 1.5x1.5 hole 0.9: 1(0,0)
  round 1.5 hole 0.9: 2(2.54,0) 3(5.08,0) 4(7.62,0) 5(10.16,0) 6(12.7,0) 7(15.24,0) 8(17.78,0) 9(20.32,0) 10(22.86,0) 11(25.4,0) 12(27.94,0) 13(30.48,0) 14(33.02,0) 15(35.56,0) 16(38.1,0) 17(40.64,0) 18(43.18,0) 19(45.72,0) 20(48.26,0) 21(48.26,15.24) 22(45.72,15.24) 23(43.18,15.24) 24(40.64,15.24) 25(38.1,15.24) 26(35.56,15.24) 27(33.02,15.24) 28(30.48,15.24) 29(27.94,15.24) 30(25.4,15.24) 31(22.86,15.24) 32(20.32,15.24) 33(17.78,15.24) 34(15.24,15.24) 35(12.7,15.24) 36(10.16,15.24) 37(7.62,15.24) 38(5.08,15.24) 39(2.54,15.24) 40(0,15.24)
Top Overlay:
  lines w0.2: -2.37,1.17 50.63,1.17 50.63,14.07 -2.37,14.07 -2.37,8.255 cw(c-2.37,7.62) -2.37,6.985 -2.37,1.17
3D body "DIP40-600.STEP": height 5.7, standoff -2.58, extent -2.125,-0.165 50.325,15.325

## DIP-4 [mm] "DIP, 4-Pin, Row Spacing 7.62 mm, Pitch 2.54 mm"
height 4.57
pads (4):
  rect 1.5x1.5 hole 0.813: 1(-3.81,1.27)
  round 1.5 hole 0.813: 2(-3.81,-1.27) 3(3.81,-1.27) 4(3.81,1.27)
Top Overlay:
  circle w0.25: c-3.81,2.57 r0.125
  circle w0.6: c-1.65,1.55 r0.3
  lines w0.2: -2.65,-2.55 -2.65,2.55 -0.635,2.55 ccw(c0,2.55) 0.635,2.55 2.65,2.55 2.65,-2.55 -2.65,-2.55
Mechanical 13:
  circle w0.1: c-2.25,1.6 r0.5
  lines w0.1: -3.15,-2.5 -3.15,2.5 3.15,2.5 3.15,-2.5 -3.15,-2.5
Mechanical 15:
  lines w0.1: -0.5,0 0.5,0 ; 0,-0.5 0,0.5
3D body "DIP-4.step": height 4.31, standoff -3.28, extent -4,-2.77 4,2.77

## DIP-6 [mm] "DIP, 6-Pin, Row Spacing 7.62 mm, Pitch 2.54 mm"
height 5.46
pads (6):
  rect 1.5x1.5 hole 0.813: 1(-3.81,2.54)
  round 1.5 hole 0.813: 2(-3.81,0) 3(-3.81,-2.54) 4(3.81,-2.54) 5(3.81,0) 6(3.81,2.54)
Top Overlay:
  circle w0.6: c-1.65,3.7 r0.3
  circle w0.25: c-3.81,3.84 r0.125
  lines w0.2: -2.65,-4.7 2.65,-4.7 2.65,4.7 0.635,4.7 cw(c0,4.7) -0.635,4.7 -2.65,4.7 -2.65,-4.7
Mechanical 13:
  circle w0.1: c-2.65,3.8 r0.5
  lines w0.1: -3.55,-4.7 3.55,-4.7 3.55,4.7 -3.55,4.7 -3.55,-4.7
Mechanical 15:
  lines w0.1: -0.5,0 0.5,0 ; 0,-0.5 0,0.5
3D body "DIP-6.step": height 5.22, standoff -2.57, extent -3.937,-4.406 3.943,4.394

## DIP-8 [mm] "DIP, 8-Pin, Row Spacing 7.62 mm, Pitch 2.54 mm"
height 5.33
pads (8):
  rect 1.5x1.5 hole 0.813: 1(-3.81,3.81)
  round 1.5 hole 0.813: 2(-3.81,1.27) 3(-3.81,-1.27) 4(-3.81,-3.81) 5(3.81,-3.81) 6(3.81,-1.27) 7(3.81,1.27) 8(3.81,3.81)
Top Overlay:
  circle w0.6: c-1.65,4.15 r0.3
  circle w0.25: c-3.81,5.11 r0.125
  lines w0.2: -2.65,-5.15 2.65,-5.15 2.65,5.15 0.635,5.15 cw(c0,5.15) -0.635,5.15 -2.65,5.15 -2.65,-5.15
Mechanical 13:
  circle w0.1: c-2.7,4.25 r0.5
  lines w0.1: -3.6,-5.15 3.6,-5.15 3.6,5.15 -3.6,5.15 -3.6,-5.15
Mechanical 15:
  lines w0.1: -0.5,0 0.5,0 ; 0,-0.5 0,0.5
3D body "DIP-8.STEP": height 4.57, standoff -3.81, extent -3.912,-4.954 3.908,4.956

## DIP-14 [mm] "DIP, 14-Pin, Row Spacing 7.62 mm, Pitch 2.54 mm"
height 5.08
pads (14):
  rect 1.5x1.5 hole 0.813: 1(-3.81,7.62)
  round 1.5 hole 0.813: 2(-3.81,5.08) 3(-3.81,2.54) 4(-3.81,0) 5(-3.81,-2.54) 6(-3.81,-5.08) 7(-3.81,-7.62) 8(3.81,-7.62) 9(3.81,-5.08) 10(3.81,-2.54) 11(3.81,0) 12(3.81,2.54) 13(3.81,5.08) 14(3.81,7.62)
Top Overlay:
  circle w0.25: c-3.81,8.92 r0.125
  circle w0.6: c-1.65,9.1 r0.3
  lines w0.2: -2.65,-10.1 -2.65,10.1 -0.635,10.1 ccw(c0,10.1) 0.635,10.1 2.65,10.1 2.65,-10.1 -2.65,-10.1
Mechanical 13:
  circle w0.1: c-2.7,9.2 r0.5
  lines w0.1: -3.6,-10.1 -3.6,10.1 3.6,10.1 3.6,-10.1 -3.6,-10.1
Mechanical 15:
  lines w0.1: -0.5,0 0.5,0 ; 0,-0.5 0,0.5
3D body "DIP-14N.step": height 5.1, standoff -3.3, extent -3.935,-9.987 3.935,10.013

## DIP-16 [mm] "DIP, 16-Pin, Row Spacing 7.62 mm, Pitch 2.54 mm"
height 5.08
pads (16):
  rect 1.5x1.5 hole 0.813: 1(-3.81,8.89)
  round 1.5 hole 0.813: 2(-3.81,6.35) 3(-3.81,3.81) 4(-3.81,1.27) 5(-3.81,-1.27) 6(-3.81,-3.81) 7(-3.81,-6.35) 8(-3.81,-8.89) 9(3.81,-8.89) 10(3.81,-6.35) 11(3.81,-3.81) 12(3.81,-1.27) 13(3.81,1.27) 14(3.81,3.81) 15(3.81,6.35) 16(3.81,8.89)
Top Overlay:
  circle w0.25: c-3.81,10.19 r0.125
  circle w0.6: c-1.65,9.3 r0.3
  lines w0.2: -2.65,-10.3 -2.65,10.3 -0.635,10.3 ccw(c0,10.3) 0.635,10.3 2.65,10.3 2.65,-10.3 -2.65,-10.3
Mechanical 13:
  circle w0.1: c-2.7,9.375 r0.5
  lines w0.1: -3.6,-10.275 -3.6,10.275 3.6,10.275 3.6,-10.275 -3.6,-10.275
Mechanical 15:
  lines w0.1: -0.5,0 0.5,0 ; 0,-0.5 0,0.5
3D body "DIP-16N.step": height 5.1, standoff -3.3, extent -3.935,-10.165 3.935,9.835